# Altium footprint library 通讯接口.PcbLib: 46 footprints (part 1 of 3)
Each footprint in its own frame and in the unit in brackets; x right, y up, seen from the top. Pads: shape width x height; smd on the part's side, far side on the other; paste and mask are expansions set on the pad; w line width, h text height; cw(c..) or ccw(c..) is an arc to the next point about the centre after c.
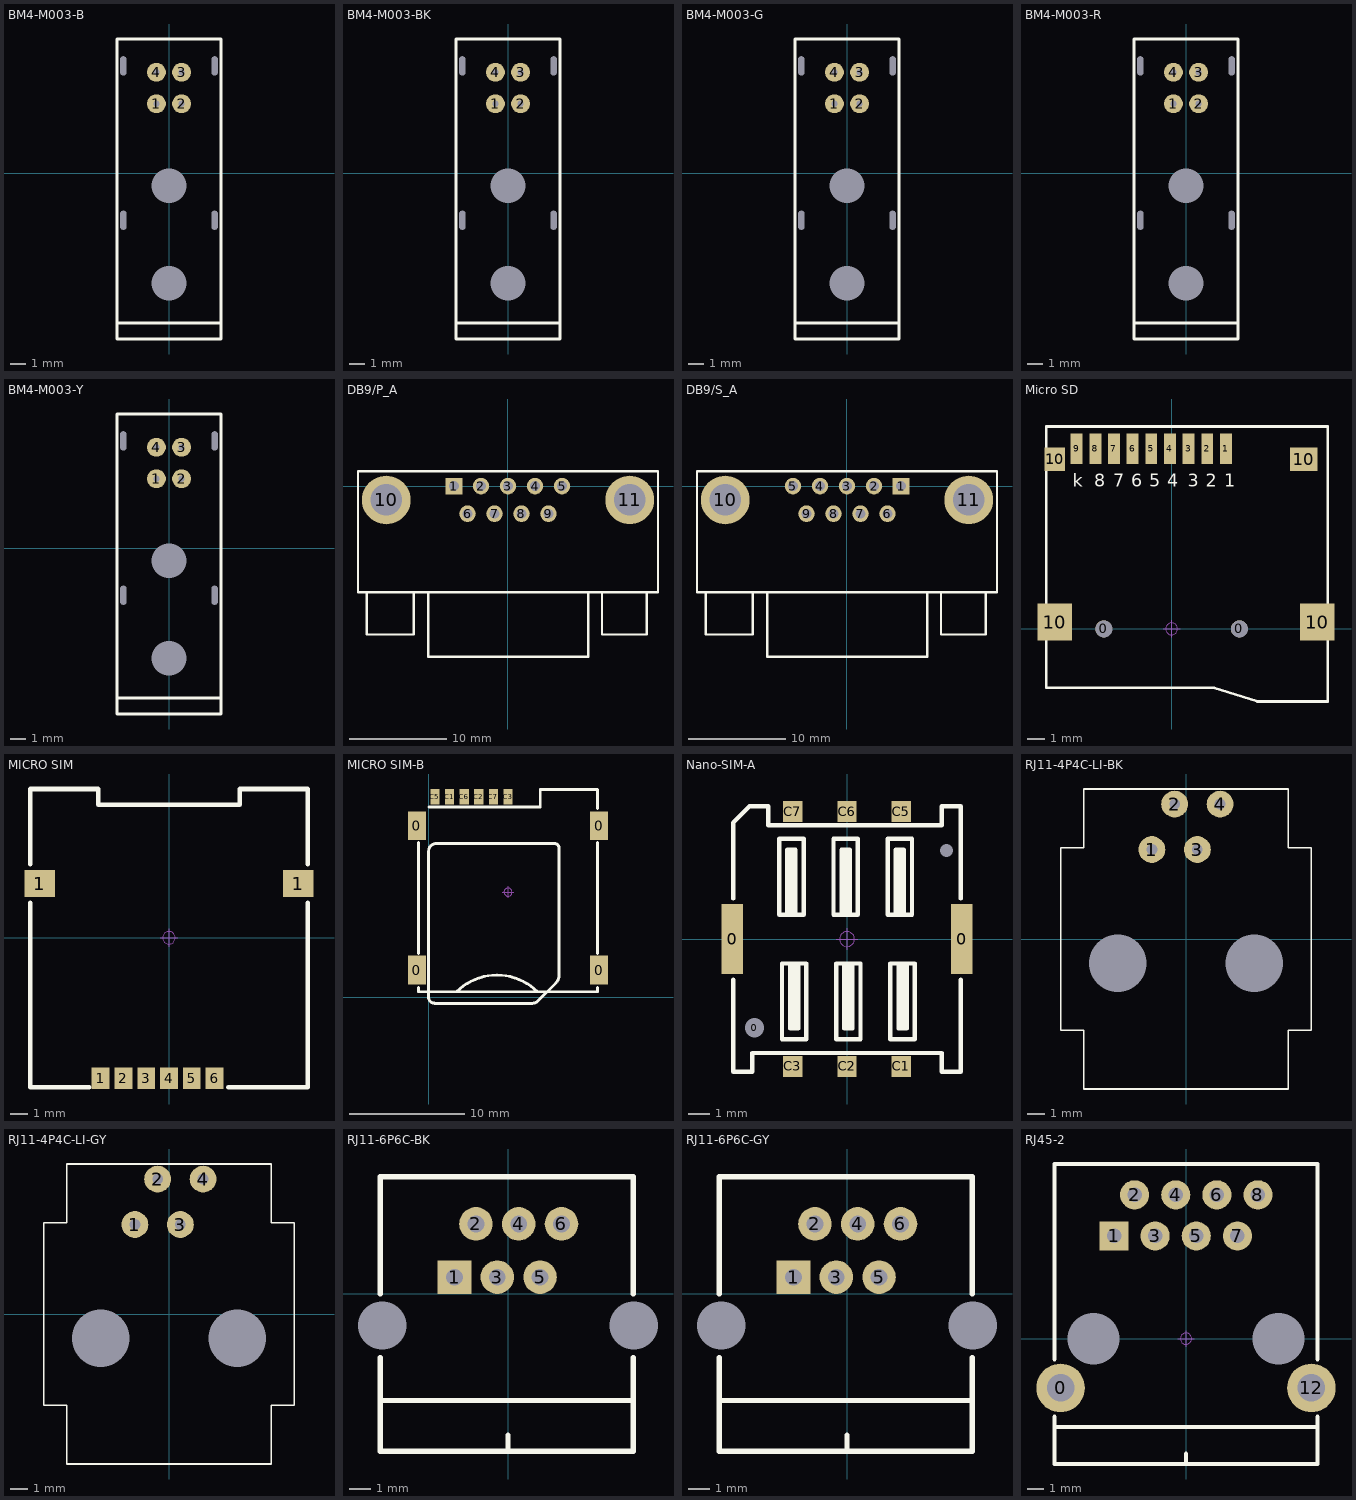
[diagram p0: the footprints below, top view; thin cyan lines are the x and y axes]

## BM4-M003-B [mm] "宝马头板端弯头（蓝色）"
pads (10):
  round 0 hole 0.4 slot 1.2 at 90 deg unplated: 0(-2.9,-3) 0(-2.9,6.8) 0(2.9,-3) 0(2.9,6.8)
  round 0 hole 2.2 unplated: 0(0,-7) 0(0,-0.8)
  round 1.2 hole 0.4: 1(-0.8,4.4) 2(0.8,4.4) 3(0.8,6.4) 4(-0.8,6.4)
Top Overlay:
  lines w0.203: -3.302,-9.525 3.302,-9.525 ; -3.302,-10.541 3.302,-10.541 3.302,8.509 -3.302,8.509 -3.302,-10.541
3D body: height 6.65, standoff -2.15, extent -3.1,-10.45 3.1,8.45

## BM4-M003-BK [mm] "宝马头板端弯头（黑色）"
pads (10):
  round 0 hole 0.4 slot 1.2 at 90 deg unplated: 0(-2.9,-3) 0(-2.9,6.8) 0(2.9,-3) 0(2.9,6.8)
  round 0 hole 2.2 unplated: 0(0,-7) 0(0,-0.8)
  round 1.2 hole 0.4: 1(-0.8,4.4) 2(0.8,4.4) 3(0.8,6.4) 4(-0.8,6.4)
Top Overlay:
  lines w0.203: -3.302,-9.525 3.302,-9.525 ; -3.302,-10.541 3.302,-10.541 3.302,8.509 -3.302,8.509 -3.302,-10.541
3D body: height 6.65, standoff -2.15, extent -3.1,-10.45 3.1,8.45

## BM4-M003-G [mm] "宝马头板端弯头（绿色）"
pads (10):
  round 0 hole 0.4 slot 1.2 at 90 deg unplated: 0(-2.9,-3) 0(-2.9,6.8) 0(2.9,-3) 0(2.9,6.8)
  round 0 hole 2.2 unplated: 0(0,-7) 0(0,-0.8)
  round 1.2 hole 0.4: 1(-0.8,4.4) 2(0.8,4.4) 3(0.8,6.4) 4(-0.8,6.4)
Top Overlay:
  lines w0.203: -3.302,-9.525 3.302,-9.525 ; -3.302,-10.541 -3.302,8.509 3.302,8.509 3.302,-10.541 -3.302,-10.541
3D body: height 6.65, standoff -2.15, extent -3.1,-10.45 3.1,8.45

## BM4-M003-R [mm] "宝马头板端弯头（红色）"
pads (10):
  round 0 hole 0.4 slot 1.2 at 90 deg unplated: 0(-2.9,-3) 0(-2.9,6.8) 0(2.9,-3) 0(2.9,6.8)
  round 0 hole 2.2 unplated: 0(0,-7) 0(0,-0.8)
  round 1.2 hole 0.4: 1(-0.8,4.4) 2(0.8,4.4) 3(0.8,6.4) 4(-0.8,6.4)
Top Overlay:
  lines w0.203: -3.302,-9.525 3.302,-9.525 ; -3.302,-10.541 -3.302,8.509 3.302,8.509 3.302,-10.541 -3.302,-10.541
3D body: height 6.65, standoff -2.15, extent -3.1,-10.45 3.1,8.45

## BM4-M003-Y [mm] "宝马头板端弯头（黄色）"
pads (10):
  round 0 hole 0.4 slot 1.2 at 90 deg unplated: 0(-2.9,-3) 0(-2.9,6.8) 0(2.9,-3) 0(2.9,6.8)
  round 0 hole 2.2 unplated: 0(0,-7) 0(0,-0.8)
  round 1.2 hole 0.4: 1(-0.8,4.4) 2(0.8,4.4) 3(0.8,6.4) 4(-0.8,6.4)
Top Overlay:
  lines w0.203: -3.302,-9.525 3.302,-9.525 ; -3.302,-10.541 -3.302,8.509 3.302,8.509 3.302,-10.541 -3.302,-10.541
3D body: height 6.65, standoff -2.15, extent -3.1,-10.45 3.1,8.45

## DB9/P_A [mm] "9针公头串口,31*18.5*12.5mm"
pads (11):
  rect 1.7x1.7 hole 1: 1(-5.546,0)
  round 1.7 hole 1: 2(-2.773,0) 3(0,0) 4(2.773,0) 5(5.546,0) 6(-4.155,-2.84) 7(-1.385,-2.84) 8(1.385,-2.84) 9(4.155,-2.84)
  round 5 hole 3.25: 10(-12.5,-1.42) 11(12.5,-1.42)
Top Overlay:
  lines w0.254: -14.478,-10.922 -14.478,-15.24 -9.652,-15.24 -9.652,-10.922 ; -8.175,-10.922 -8.175,-17.526 8.225,-17.526 8.225,-10.922 ; 9.652,-10.922 9.652,-15.24 14.224,-15.24 14.224,-10.922 ; -15.4,-10.922 15.4,-10.922 15.4,1.524 -15.4,1.524 -15.4,-10.922
Mechanical 15:
  circle w0.05: c0,0 r0.35
  lines w0.05: -0.5,0 0.5,0 ; 0,-0.5 0,0.5
3D body: height 12.65, standoff -3.16, extent -15.45,-17.247 15.45,1.253

## DB9/S_A [mm] "9针母头串口,31*18.5*12.5mm"
pads (11):
  rect 1.7x1.7 hole 1: 1(5.546,0)
  round 1.7 hole 1: 2(2.773,0) 3(0,0) 4(-2.773,0) 5(-5.546,0) 6(4.155,-2.84) 7(1.385,-2.84) 8(-1.385,-2.84) 9(-4.155,-2.84)
  round 5 hole 3.25: 10(-12.5,-1.42) 11(12.5,-1.42)
Top Overlay:
  lines w0.254: -14.478,-10.922 -14.478,-15.24 -9.652,-15.24 -9.652,-10.922 ; -8.175,-10.922 -8.175,-17.526 8.225,-17.526 8.225,-10.922 ; 9.652,-10.922 9.652,-15.24 14.224,-15.24 14.224,-10.922 ; -15.4,-10.922 15.4,-10.922 15.4,1.524 -15.4,1.524 -15.4,-10.922
Mechanical 15:
  circle w0.05: c0,0 r0.35
  lines w0.05: -0.5,0 0.5,0 ; 0,-0.5 0,0.5
3D body: height 12.65, standoff -3.16, extent -15.45,-17.247 15.45,1.253

## Micro SD [mm]
pads (15):
  round 1 hole 1 unplated: 0(-4,0) 0(4,0)
  rect 0.7x1.8 smd: 1(3.2,10.627) 2(2.1,10.627) 3(1,10.627) 4(-0.1,10.627) 5(-1.2,10.627) 6(-2.3,10.627) 7(-3.4,10.627) 8(-4.5,10.627) 9(-5.6,10.627)
  rect 2.032x2.2 smd: 10(-6.9,0.4) 10(8.6,0.4)
  rect 1.2x1.4 smd: 10(-6.9,10)
  rect 1.6x1.4 smd: 10(7.8,10)
Top Overlay:
  lines w0.152: 2.489,-3.47 5.054,-4.283 9.204,-4.283 9.204,11.938 -7.402,11.938 -7.402,-3.47 2.514,-3.47
  text "k" at -5.842,8.382 h0.76
  text "8" at -4.572,8.382 h0.76
  text "7" at -3.455,8.382 h0.76
  text "6" at -2.388,8.382 h0.76
  text "5" at -1.321,8.382 h0.76
  text "4" at -0.254,8.382 h0.76
  text "3" at 0.939,8.382 h0.76
  text "2" at 2.006,8.382 h0.76
  text "1" at 3.098,8.382 h0.76
Mechanical 15:
  circle w0.05: c0,0 r0.35
  lines w0.05: -0.5,0 0.5,0 ; 0,-0.5 0,0.5
3D body: height 2, standoff -0.45, extent -7.05,-4 8.95,11.25

## MICRO SIM [mm] "16.30mm*14.66mm*1.8mm(长*宽*厚）"
pads (8):
  rect 1.7x1.5 smd: 1(-7.2,3.02) 1(7.2,3.02)
  rect 1x1.2 smd: 1(-3.81,-7.83) 2(-2.54,-7.83) 3(-1.27,-7.83) 4(0,-7.83) 5(1.27,-7.83) 6(2.54,-7.83)
Top Overlay:
  lines w0.254: -7.747,1.949 -7.747,-8.338 -4.445,-8.338 ; -7.747,4.108 -7.747,8.299 -3.937,8.299 -3.937,7.41 3.937,7.41 3.937,8.299 7.747,8.299 7.747,4.108 ; 3.302,-8.338 7.747,-8.338 7.747,1.949
Mechanical 15:
  circle w0.05: c0,0 r0.35
  lines w0.05: -0.5,0 0.5,0 ; 0,-0.5 0,0.5
3D body: height 1.85, standoff 0.04, extent -7.58,-8.13 7.58,8.13

## MICRO SIM-B [mm]
pads (10):
  rect 1.55x2.5 smd: 0(-1.019,2.371) 0(-1.019,14.891) 0(14.781,2.371) 0(14.781,14.891)
  rect 0.8x1.35 smd: C1(1.811,17.396) C2(4.351,17.396) C3(6.891,17.396) C5(0.541,17.396) C6(3.081,17.396) C7(5.621,17.396)
Top Overlay:
  lines w0.254: -0.866,0.873 -0.866,0.492 14.628,0.492 14.628,0.873 ; -0.866,3.794 -0.866,13.446 ; 0.023,16.494 9.675,16.494 9.675,18.018 14.628,18.018 14.628,16.367 ; 0.5,-0.508 9.017,-0.508 ccw(c9.017,0.105) 9.451,-0.328 11.034,1.255 ccw(c10.383,1.905) 11.303,1.905 11.303,2.794 11.303,12.954 ccw(c10.922,12.954) 10.922,13.335 10.287,13.335 ; 0.5,-0.5 cw(c0.5,0) 0,0 0,12.7 cw(c0.635,12.7) 0.635,13.335 10.668,13.335 ; 2.436,0.492 cw(c5.928,-3.001) 9.421,0.492 ; 14.628,3.794 14.628,13.446
Mechanical 15:
  circle w0.05: c6.881,9.128 r0.35
  lines w0.05: 6.381,9.128 7.381,9.128 ; 6.881,8.628 6.881,9.628
3D body: height 1.4, standoff 0.03, extent -1.389,0.628 15.151,17.848

## Nano-SIM-A [mm] "SIM卡座"
pads (10):
  rect 1x3.29 smd: 0(-5.385,0) 0(5.385,0)
  round 0.6 hole 0.9: 0(-4.34,-4.15)
  round 0 hole 0.6: 0(4.66,4.15)
  rect 0.9x1 smd: C1(2.54,-5.97) C2(0,-5.97) C3(-2.54,-5.97) C5(2.54,5.98) C6(0,5.98) C7(-2.54,5.98)
Top Overlay:
  lines w0.203: -5.334,-1.905 -5.334,-6.223 -4.445,-6.223 -4.445,-5.334 4.445,-5.334 4.445,-6.223 5.334,-6.223 5.334,-1.905 ; -5.334,1.905 -5.334,5.461 -4.572,6.223 -3.683,6.223 -3.683,5.334 4.445,5.334 4.445,6.223 5.334,6.223 5.334,1.905 ; -2.794,1.143 -2.794,4.191 -2.413,4.191 -2.413,1.143 ; -2.667,-1.143 -2.667,-4.191 -2.286,-4.191 -2.286,-1.143 ; -2.667,1.143 -2.667,4.064 ; -2.54,-4.191 -2.54,-1.143 ; -2.54,1.143 -2.54,4.191 ; -2.413,-4.064 -2.413,-1.143 ; -0.254,1.143 -0.254,4.191 0.127,4.191 0.127,1.143 ; -0.127,-1.143 -0.127,-4.191 0.254,-4.191 0.254,-1.143 ; -0.127,1.143 -0.127,4.064 ; 0,-4.191 0,-1.143 ; 0,1.143 0,4.191 ; 0.127,-4.064 0.127,-1.143 ; 2.286,1.143 2.286,4.191 2.667,4.191 2.667,1.143 ; 2.413,-1.143 2.413,-4.191 2.794,-4.191 2.794,-1.143 ; 2.413,1.143 2.413,4.064 ; 2.54,-4.191 2.54,-1.143 ; 2.54,1.143 2.54,4.191 ; 2.667,-4.064 2.667,-1.143 ; -3.175,1.143 -3.175,4.699 -2.032,4.699 -2.032,1.143 -3.175,1.143 ; -3.048,-4.699 -3.048,-1.143 -1.905,-1.143 -1.905,-4.699 -3.048,-4.699 ; -0.635,1.143 0.508,1.143 0.508,4.699 -0.635,4.699 -0.635,1.143 ; -0.508,-4.699 -0.508,-1.143 0.635,-1.143 0.635,-4.699 -0.508,-4.699 ; 1.905,1.143 3.048,1.143 3.048,4.699 1.905,4.699 1.905,1.143 ; 2.032,-4.699 3.175,-4.699 3.175,-1.143 2.032,-1.143 2.032,-4.699
Mechanical 15:
  circle w0.05: c0,0 r0.35
  lines w0.05: -0.5,0 0.5,0 ; 0,-0.5 0,0.5
3D body: height 1.45, standoff -0.25, extent -5.685,-6.15 5.685,6.15

## RJ11-4P4C-LI-BK [mm] "16.5mm*13.8mm*16.38mm(长*宽*高)"
pads (6):
  round 0 hole 3.2: 0(-3.81,-1.35) 0(3.81,-1.35)
  round 1.5 hole 0.6: 1(-1.905,5) 2(-0.635,7.54) 3(0.635,5) 4(1.905,7.54)
Top Overlay:
  lines w0.1: -7,-5.1 -7,5.1 -5.715,5.1 -5.715,8.382 5.715,8.382 5.715,5.1 7,5.1 7,-5.1 5.715,-5.1 5.715,-8.382 -5.715,-8.382 -5.715,-5.1 -7,-5.1
3D body: height 16.38, standoff -3.2, extent -6.9,-8.25 6.9,8.25

## RJ11-4P4C-LI-GY [mm] "16.5mm*13.8mm*16.38mm(长*宽*高)"
pads (6):
  round 0 hole 3.2: 0(-3.81,-1.35) 0(3.81,-1.35)
  round 1.5 hole 0.6: 1(-1.905,5) 2(-0.635,7.54) 3(0.635,5) 4(1.905,7.54)
Top Overlay:
  lines w0.1: -7,-5.1 -7,5.1 -5.715,5.1 -5.715,8.382 5.715,8.382 5.715,5.1 7,5.1 7,-5.1 5.715,-5.1 5.715,-8.382 -5.715,-8.382 -5.715,-5.1 -7,-5.1
3D body: height 16.38, standoff -3.2, extent -6.9,-8.25 6.9,8.25

## RJ11-6P6C-BK [mm] "12mm*12mm*14.55mm(长*宽*高)"
pads (8):
  round 0 hole 2.3: 0(-6,-1.5) 0(6,-1.5)
  rect 1.6x1.6 hole 0.8: 1(-2.55,0.8)
  round 1.6 hole 0.8: 2(-1.53,3.34) 3(-0.51,0.8) 4(0.51,3.34) 5(1.53,0.8) 6(2.55,3.34)
Top Overlay:
  lines w0.254: -6.096,-5.08 5.969,-5.08 ; -6.096,-3.048 -6.096,-7.5 5.969,-7.5 5.969,-3.048 ; -6.096,0 -6.096,5.588 5.969,5.588 5.969,0 ; 0,-7.5 0,-6.731
3D body: height 14.6, standoff -3.45, extent -7.15,-7.5 7.15,5.5

## RJ11-6P6C-GY [mm] "12mm*12mm*14.55mm(长*宽*高)"
pads (8):
  round 0 hole 2.3: 0(-6,-1.5) 0(6,-1.5)
  rect 1.6x1.6 hole 0.8: 1(-2.55,0.8)
  round 1.6 hole 0.8: 2(-1.53,3.34) 3(-0.51,0.8) 4(0.51,3.34) 5(1.53,0.8) 6(2.55,3.34)
Top Overlay:
  lines w0.254: -6.096,-5.08 5.969,-5.08 ; -6.096,-3.048 -6.096,-7.5 5.969,-7.5 5.969,-3.048 ; -6.096,0 -6.096,5.588 5.969,5.588 5.969,0 ; 0,-7.5 0,-6.731
3D body: height 14.6, standoff -3.45, extent -7.15,-7.5 7.15,5.5

## RJ45-2 [mm] "RJ45屏蔽网络插座-短款8P"
pads (12):
  round 3 hole 1.7: 0(-7.75,-3.048) 12(7.75,-3.048)
  rect 1.8x1.8 hole 0.9: 1(-4.445,6.35)
  round 1.8 hole 0.9: 2(-3.175,8.89) 3(-1.905,6.35) 4(-0.635,8.89) 5(0.635,6.35) 6(1.905,8.89) 7(3.175,6.35) 8(4.445,8.89)
  round 0 hole 3.2 unplated: 8(-5.715,0) 9(5.715,0)
Top Overlay:
  lines w0.254: -8.128,-5.45 8.128,-5.45 ; -8.128,-4.826 -8.128,-7.747 8.128,-7.747 8.128,-4.826 ; -8.128,-1.27 -8.128,10.795 8.128,10.795 8.128,-1.27 ; 0,-7.747 0,-7.112
Mechanical 15:
  circle w0.05: c0,0 r0.35
  lines w0.05: -0.5,0 0.5,0 ; 0,-0.5 0,0.5
3D body: height 3.25, standoff -14.1, extent -7.999,-7.777 8.001,10.723